# Altium schematic symbol library con-leotronics.SCHLIB: 93 symbols (part 2 of 4)

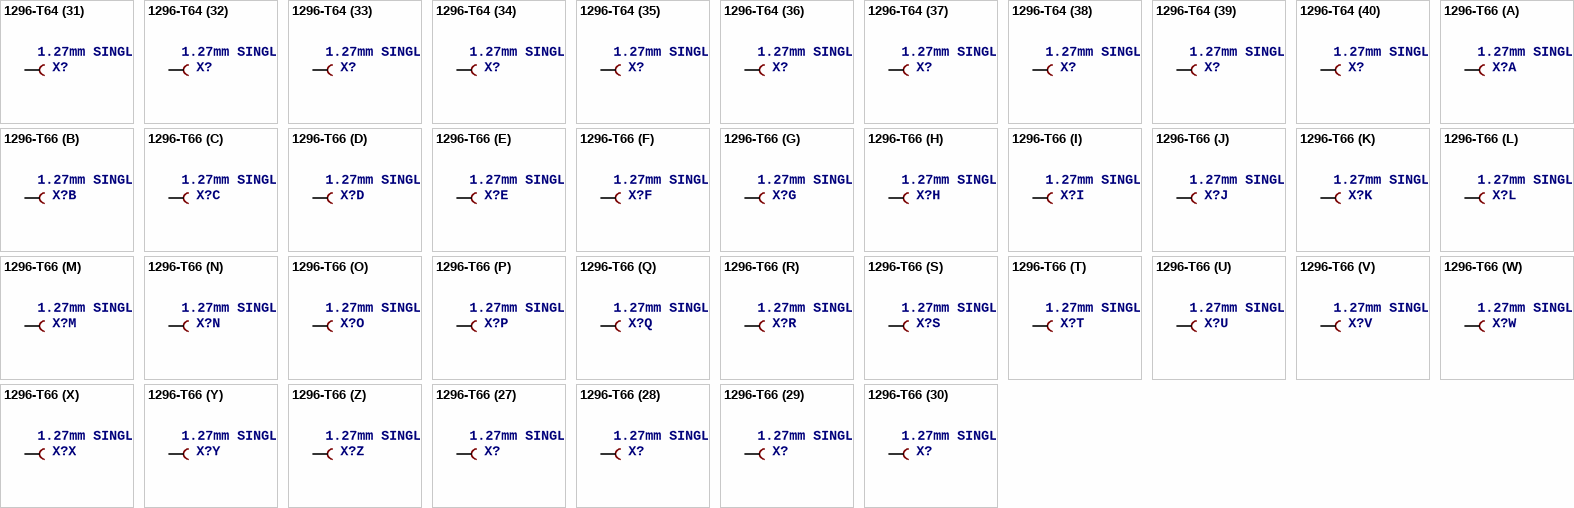
[diagram p23: symbols 1296-T64 to 1296-T66]

## 1296-T64
designator X?, comment 1.27mm SINGLE ROW FEMALE SOCKET   Source: http://www.leotronics.co.uk/Conexcon/Data%20Sheets/sec.%20A/1296ing.pdf
OC_FARNELL: unknown; OC_NEWARK: unknown
footprint 1296-64
part A pins: 1 B
part B pins: 2 B
part C pins: 3 B
part D pins: 4 B
part E pins: 5 B
part F pins: 6 B
part G pins: 7 B
part H pins: 8 B
part I pins: 9 B
part J pins: 10 B
part K pins: 11 B
part L pins: 12 B
part M pins: 13 B
part N pins: 14 B
part O pins: 15 B
part P pins: 16 B
part Q pins: 17 B
part R pins: 18 B
part S pins: 19 B
part T pins: 20 B
part U pins: 21 B
part V pins: 22 B
part W pins: 23 B
part X pins: 24 B
part Y pins: 25 B
part Z pins: 26 B
part 27 pins: 27 B
part 28 pins: 28 B
part 29 pins: 29 B
part 30 pins: 30 B
part 31 pins: 31 B
part 32 pins: 32 B
part 33 pins: 33 B
part 34 pins: 34 B
part 35 pins: 35 B
part 36 pins: 36 B
part 37 pins: 37 B
part 38 pins: 38 B
part 39 pins: 39 B
part 40 pins: 40 B
part 41 pins: 41 B
part 42 pins: 42 B
part 43 pins: 43 B
part 44 pins: 44 B
part 45 pins: 45 B
part 46 pins: 46 B
part 47 pins: 47 B
part 48 pins: 48 B
part 49 pins: 49 B
part 50 pins: 50 B
part 51 pins: 51 B
part 52 pins: 52 B
part 53 pins: 53 B
part 54 pins: 54 B
part 55 pins: 55 B
part 56 pins: 56 B
part 57 pins: 57 B
part 58 pins: 58 B
part 59 pins: 59 B
part 60 pins: 60 B
part 61 pins: 61 B
part 62 pins: 62 B
part 63 pins: 63 B
part 64 pins: 64 B

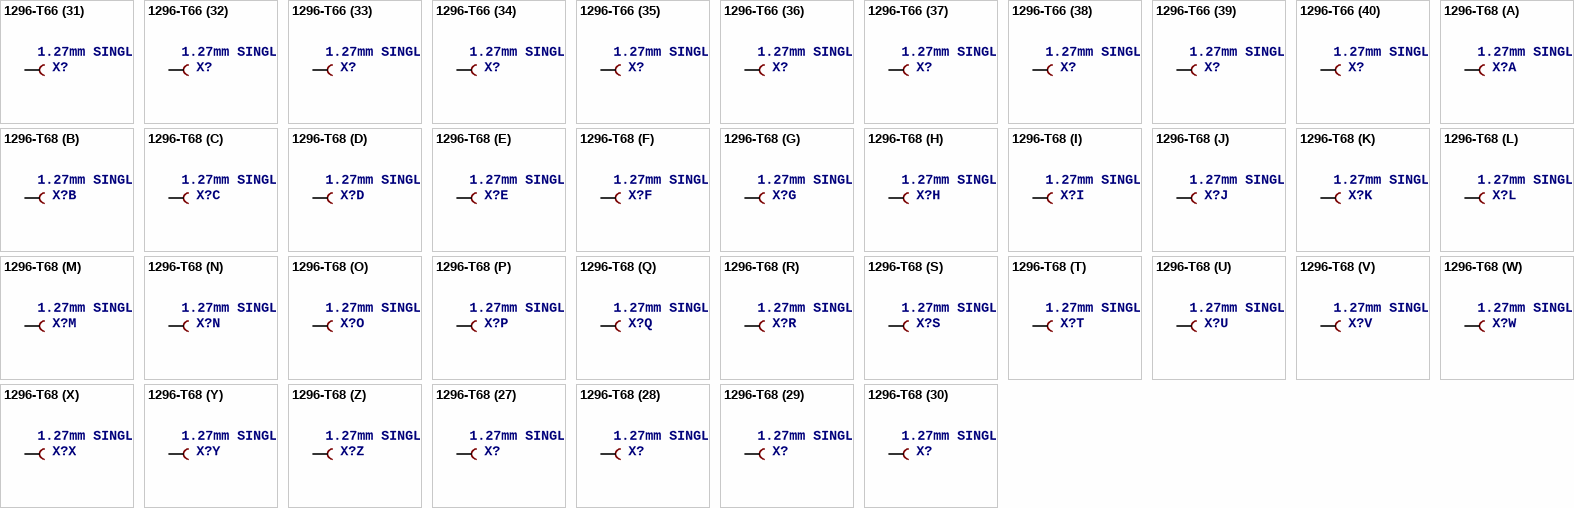
[diagram p24: symbols 1296-T66 to 1296-T68]

## 1296-T66
designator X?, comment 1.27mm SINGLE ROW FEMALE SOCKET   Source: http://www.leotronics.co.uk/Conexcon/Data%20Sheets/sec.%20A/1296ing.pdf
OC_FARNELL: unknown; OC_NEWARK: unknown
footprint 1296-66
part A pins: 1 B
part B pins: 2 B
part C pins: 3 B
part D pins: 4 B
part E pins: 5 B
part F pins: 6 B
part G pins: 7 B
part H pins: 8 B
part I pins: 9 B
part J pins: 10 B
part K pins: 11 B
part L pins: 12 B
part M pins: 13 B
part N pins: 14 B
part O pins: 15 B
part P pins: 16 B
part Q pins: 17 B
part R pins: 18 B
part S pins: 19 B
part T pins: 20 B
part U pins: 21 B
part V pins: 22 B
part W pins: 23 B
part X pins: 24 B
part Y pins: 25 B
part Z pins: 26 B
part 27 pins: 27 B
part 28 pins: 28 B
part 29 pins: 29 B
part 30 pins: 30 B
part 31 pins: 31 B
part 32 pins: 32 B
part 33 pins: 33 B
part 34 pins: 34 B
part 35 pins: 35 B
part 36 pins: 36 B
part 37 pins: 37 B
part 38 pins: 38 B
part 39 pins: 39 B
part 40 pins: 40 B
part 41 pins: 41 B
part 42 pins: 42 B
part 43 pins: 43 B
part 44 pins: 44 B
part 45 pins: 45 B
part 46 pins: 46 B
part 47 pins: 47 B
part 48 pins: 48 B
part 49 pins: 49 B
part 50 pins: 50 B
part 51 pins: 51 B
part 52 pins: 52 B
part 53 pins: 53 B
part 54 pins: 54 B
part 55 pins: 55 B
part 56 pins: 56 B
part 57 pins: 57 B
part 58 pins: 58 B
part 59 pins: 59 B
part 60 pins: 60 B
part 61 pins: 61 B
part 62 pins: 62 B
part 63 pins: 63 B
part 64 pins: 64 B
part 65 pins: 65 B
part 66 pins: 66 B

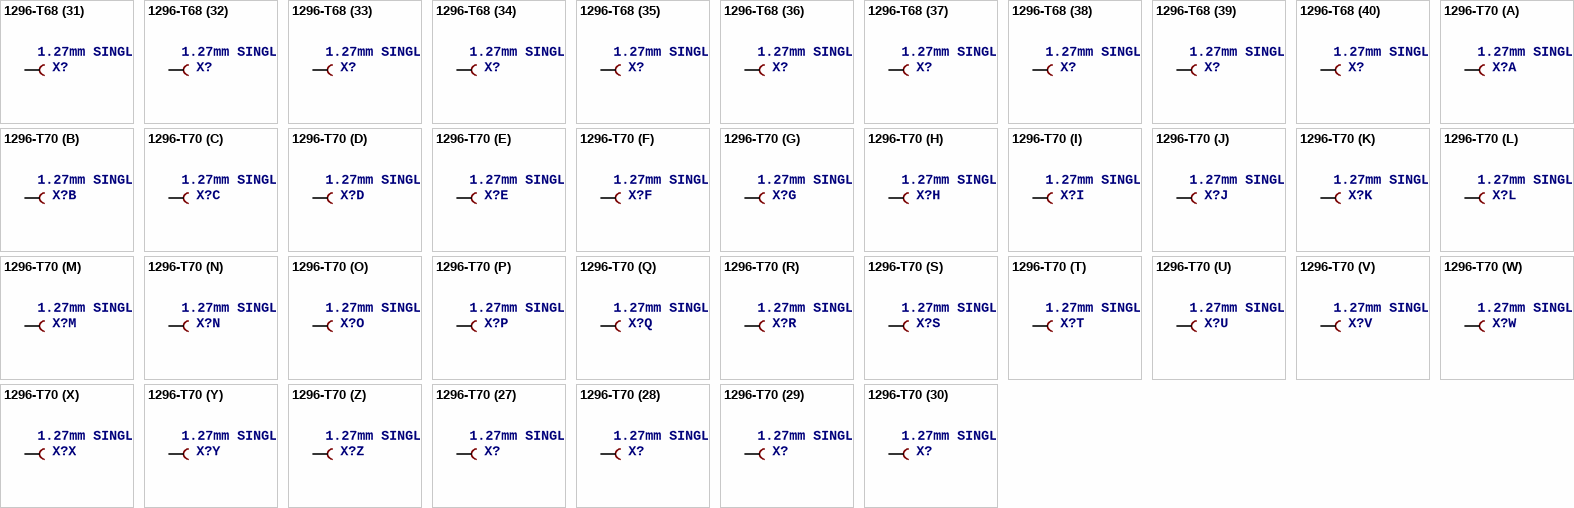
[diagram p25: symbols 1296-T68 to 1296-T70]

## 1296-T68
designator X?, comment 1.27mm SINGLE ROW FEMALE SOCKET   Source: http://www.leotronics.co.uk/Conexcon/Data%20Sheets/sec.%20A/1296ing.pdf
OC_FARNELL: unknown; OC_NEWARK: unknown
footprint 1296-68
part A pins: 1 B
part B pins: 2 B
part C pins: 3 B
part D pins: 4 B
part E pins: 5 B
part F pins: 6 B
part G pins: 7 B
part H pins: 8 B
part I pins: 9 B
part J pins: 10 B
part K pins: 11 B
part L pins: 12 B
part M pins: 13 B
part N pins: 14 B
part O pins: 15 B
part P pins: 16 B
part Q pins: 17 B
part R pins: 18 B
part S pins: 19 B
part T pins: 20 B
part U pins: 21 B
part V pins: 22 B
part W pins: 23 B
part X pins: 24 B
part Y pins: 25 B
part Z pins: 26 B
part 27 pins: 27 B
part 28 pins: 28 B
part 29 pins: 29 B
part 30 pins: 30 B
part 31 pins: 31 B
part 32 pins: 32 B
part 33 pins: 33 B
part 34 pins: 34 B
part 35 pins: 35 B
part 36 pins: 36 B
part 37 pins: 37 B
part 38 pins: 38 B
part 39 pins: 39 B
part 40 pins: 40 B
part 41 pins: 41 B
part 42 pins: 42 B
part 43 pins: 43 B
part 44 pins: 44 B
part 45 pins: 45 B
part 46 pins: 46 B
part 47 pins: 47 B
part 48 pins: 48 B
part 49 pins: 49 B
part 50 pins: 50 B
part 51 pins: 51 B
part 52 pins: 52 B
part 53 pins: 53 B
part 54 pins: 54 B
part 55 pins: 55 B
part 56 pins: 56 B
part 57 pins: 57 B
part 58 pins: 58 B
part 59 pins: 59 B
part 60 pins: 60 B
part 61 pins: 61 B
part 62 pins: 62 B
part 63 pins: 63 B
part 64 pins: 64 B
part 65 pins: 65 B
part 66 pins: 66 B
part 67 pins: 67 B
part 68 pins: 68 B

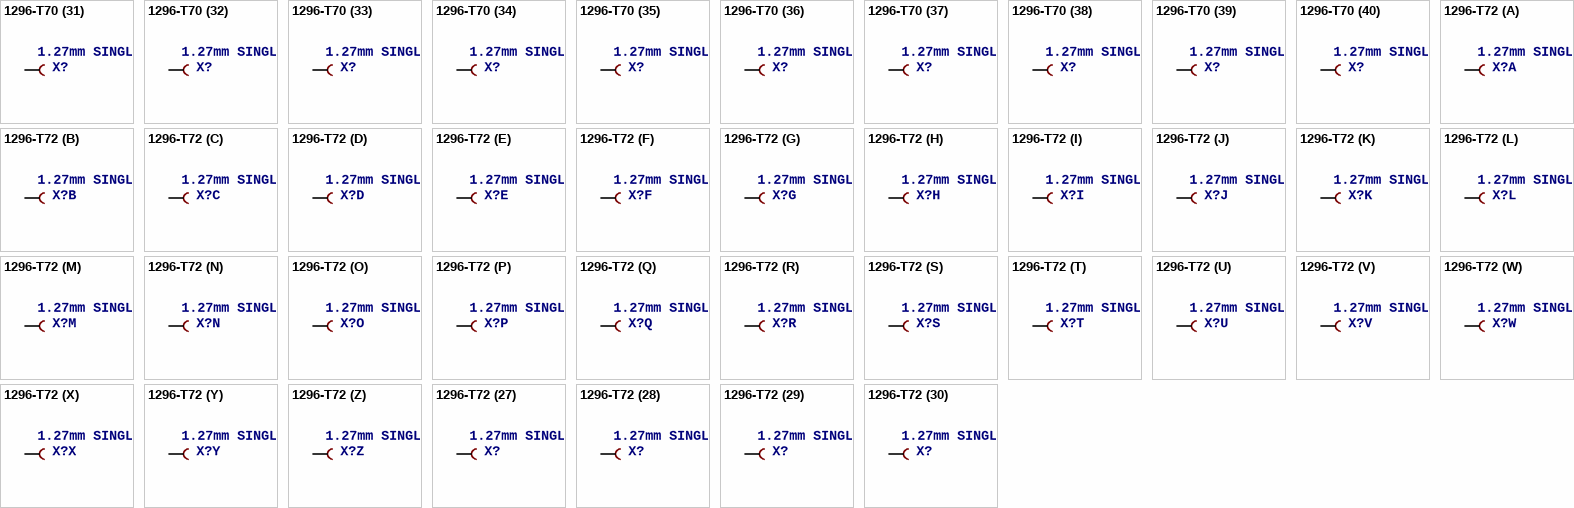
[diagram p26: symbols 1296-T70 to 1296-T72]

## 1296-T70
designator X?, comment 1.27mm SINGLE ROW FEMALE SOCKET   Source: http://www.leotronics.co.uk/Conexcon/Data%20Sheets/sec.%20A/1296ing.pdf
OC_FARNELL: unknown; OC_NEWARK: unknown
footprint 1296-70
part A pins: 1 B
part B pins: 2 B
part C pins: 3 B
part D pins: 4 B
part E pins: 5 B
part F pins: 6 B
part G pins: 7 B
part H pins: 8 B
part I pins: 9 B
part J pins: 10 B
part K pins: 11 B
part L pins: 12 B
part M pins: 13 B
part N pins: 14 B
part O pins: 15 B
part P pins: 16 B
part Q pins: 17 B
part R pins: 18 B
part S pins: 19 B
part T pins: 20 B
part U pins: 21 B
part V pins: 22 B
part W pins: 23 B
part X pins: 24 B
part Y pins: 25 B
part Z pins: 26 B
part 27 pins: 27 B
part 28 pins: 28 B
part 29 pins: 29 B
part 30 pins: 30 B
part 31 pins: 31 B
part 32 pins: 32 B
part 33 pins: 33 B
part 34 pins: 34 B
part 35 pins: 35 B
part 36 pins: 36 B
part 37 pins: 37 B
part 38 pins: 38 B
part 39 pins: 39 B
part 40 pins: 40 B
part 41 pins: 41 B
part 42 pins: 42 B
part 43 pins: 43 B
part 44 pins: 44 B
part 45 pins: 45 B
part 46 pins: 46 B
part 47 pins: 47 B
part 48 pins: 48 B
part 49 pins: 49 B
part 50 pins: 50 B
part 51 pins: 51 B
part 52 pins: 52 B
part 53 pins: 53 B
part 54 pins: 54 B
part 55 pins: 55 B
part 56 pins: 56 B
part 57 pins: 57 B
part 58 pins: 58 B
part 59 pins: 59 B
part 60 pins: 60 B
part 61 pins: 61 B
part 62 pins: 62 B
part 63 pins: 63 B
part 64 pins: 64 B
part 65 pins: 65 B
part 66 pins: 66 B
part 67 pins: 67 B
part 68 pins: 68 B
part 69 pins: 69 B
part 70 pins: 70 B

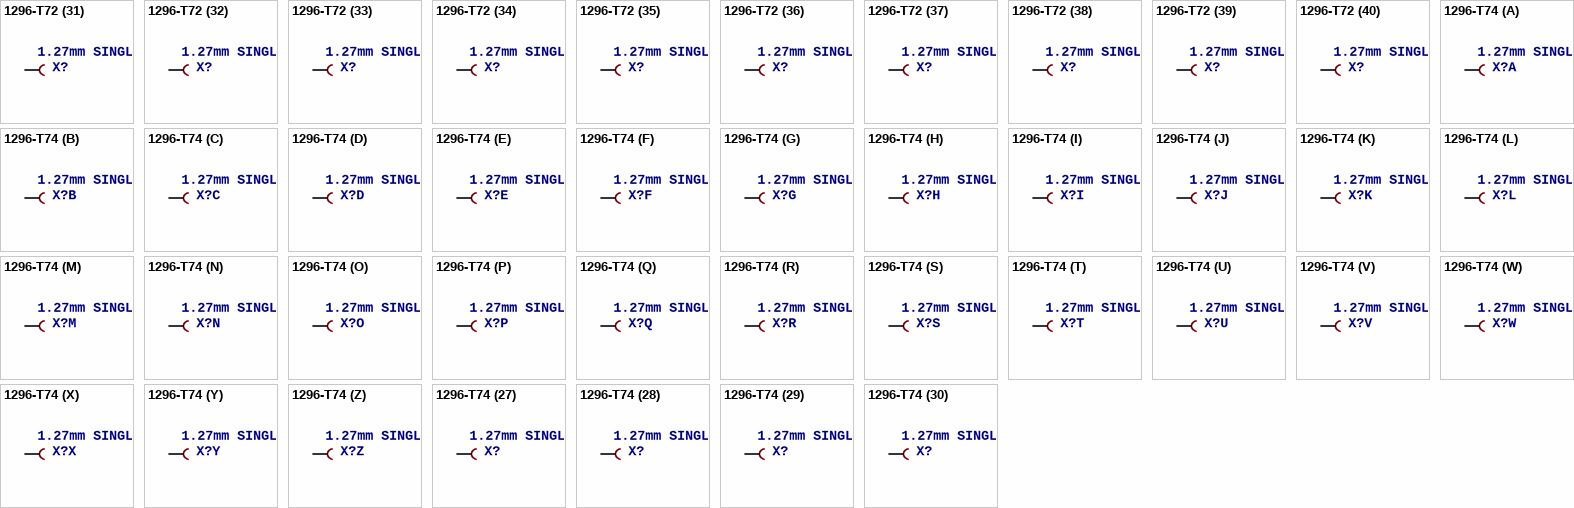
[diagram p27: symbols 1296-T72 to 1296-T74]

## 1296-T72
designator X?, comment 1.27mm SINGLE ROW FEMALE SOCKET   Source: http://www.leotronics.co.uk/Conexcon/Data%20Sheets/sec.%20A/1296ing.pdf
OC_FARNELL: unknown; OC_NEWARK: unknown
footprint 1296-72
part A pins: 1 B
part B pins: 2 B
part C pins: 3 B
part D pins: 4 B
part E pins: 5 B
part F pins: 6 B
part G pins: 7 B
part H pins: 8 B
part I pins: 9 B
part J pins: 10 B
part K pins: 11 B
part L pins: 12 B
part M pins: 13 B
part N pins: 14 B
part O pins: 15 B
part P pins: 16 B
part Q pins: 17 B
part R pins: 18 B
part S pins: 19 B
part T pins: 20 B
part U pins: 21 B
part V pins: 22 B
part W pins: 23 B
part X pins: 24 B
part Y pins: 25 B
part Z pins: 26 B
part 27 pins: 27 B
part 28 pins: 28 B
part 29 pins: 29 B
part 30 pins: 30 B
part 31 pins: 31 B
part 32 pins: 32 B
part 33 pins: 33 B
part 34 pins: 34 B
part 35 pins: 35 B
part 36 pins: 36 B
part 37 pins: 37 B
part 38 pins: 38 B
part 39 pins: 39 B
part 40 pins: 40 B
part 41 pins: 41 B
part 42 pins: 42 B
part 43 pins: 43 B
part 44 pins: 44 B
part 45 pins: 45 B
part 46 pins: 46 B
part 47 pins: 47 B
part 48 pins: 48 B
part 49 pins: 49 B
part 50 pins: 50 B
part 51 pins: 51 B
part 52 pins: 52 B
part 53 pins: 53 B
part 54 pins: 54 B
part 55 pins: 55 B
part 56 pins: 56 B
part 57 pins: 57 B
part 58 pins: 58 B
part 59 pins: 59 B
part 60 pins: 60 B
part 61 pins: 61 B
part 62 pins: 62 B
part 63 pins: 63 B
part 64 pins: 64 B
part 65 pins: 65 B
part 66 pins: 66 B
part 67 pins: 67 B
part 68 pins: 68 B
part 69 pins: 69 B
part 70 pins: 70 B
part 71 pins: 71 B
part 72 pins: 72 B

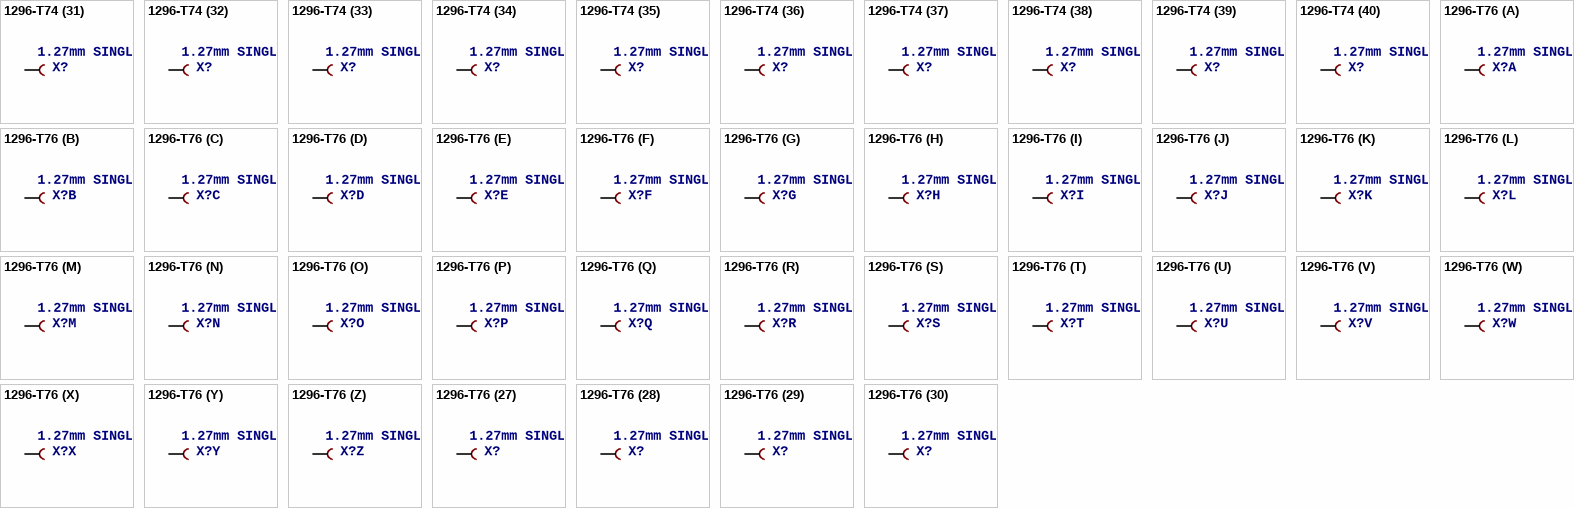
[diagram p28: symbols 1296-T74 to 1296-T76]

## 1296-T74
designator X?, comment 1.27mm SINGLE ROW FEMALE SOCKET   Source: http://www.leotronics.co.uk/Conexcon/Data%20Sheets/sec.%20A/1296ing.pdf
OC_FARNELL: unknown; OC_NEWARK: unknown
footprint 1296-74
part A pins: 1 B
part B pins: 2 B
part C pins: 3 B
part D pins: 4 B
part E pins: 5 B
part F pins: 6 B
part G pins: 7 B
part H pins: 8 B
part I pins: 9 B
part J pins: 10 B
part K pins: 11 B
part L pins: 12 B
part M pins: 13 B
part N pins: 14 B
part O pins: 15 B
part P pins: 16 B
part Q pins: 17 B
part R pins: 18 B
part S pins: 19 B
part T pins: 20 B
part U pins: 21 B
part V pins: 22 B
part W pins: 23 B
part X pins: 24 B
part Y pins: 25 B
part Z pins: 26 B
part 27 pins: 27 B
part 28 pins: 28 B
part 29 pins: 29 B
part 30 pins: 30 B
part 31 pins: 31 B
part 32 pins: 32 B
part 33 pins: 33 B
part 34 pins: 34 B
part 35 pins: 35 B
part 36 pins: 36 B
part 37 pins: 37 B
part 38 pins: 38 B
part 39 pins: 39 B
part 40 pins: 40 B
part 41 pins: 41 B
part 42 pins: 42 B
part 43 pins: 43 B
part 44 pins: 44 B
part 45 pins: 45 B
part 46 pins: 46 B
part 47 pins: 47 B
part 48 pins: 48 B
part 49 pins: 49 B
part 50 pins: 50 B
part 51 pins: 51 B
part 52 pins: 52 B
part 53 pins: 53 B
part 54 pins: 54 B
part 55 pins: 55 B
part 56 pins: 56 B
part 57 pins: 57 B
part 58 pins: 58 B
part 59 pins: 59 B
part 60 pins: 60 B
part 61 pins: 61 B
part 62 pins: 62 B
part 63 pins: 63 B
part 64 pins: 64 B
part 65 pins: 65 B
part 66 pins: 66 B
part 67 pins: 67 B
part 68 pins: 68 B
part 69 pins: 69 B
part 70 pins: 70 B
part 71 pins: 71 B
part 72 pins: 72 B
part 73 pins: 73 B
part 74 pins: 74 B

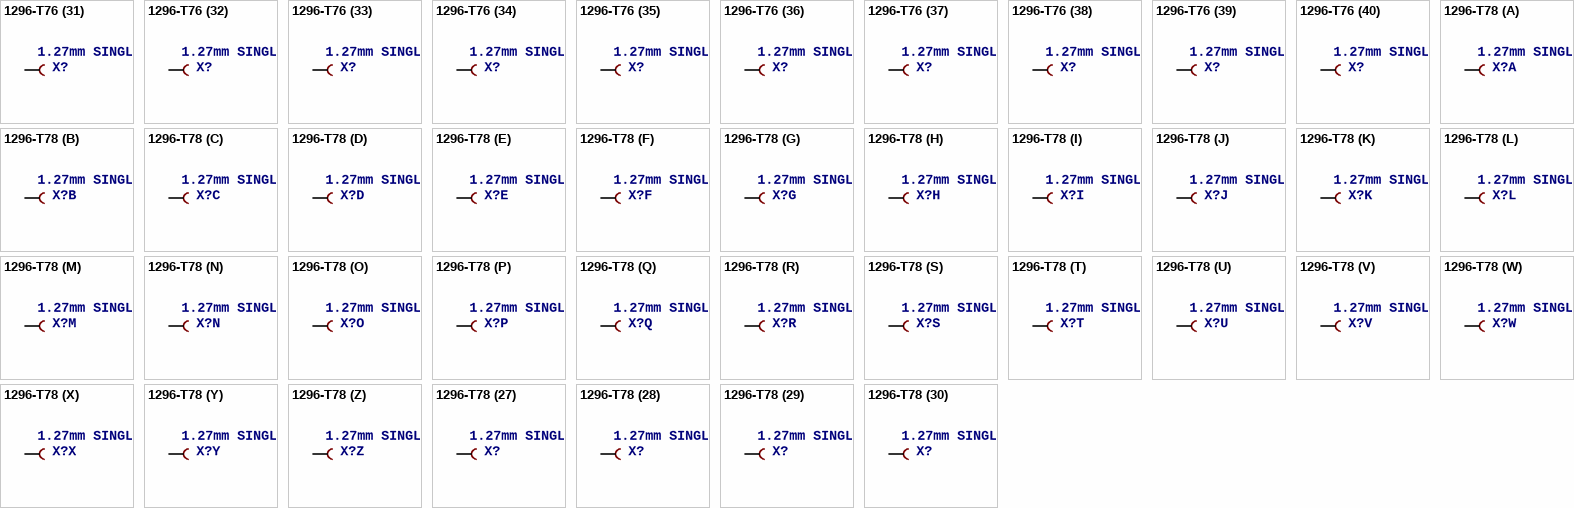
[diagram p29: symbols 1296-T76 to 1296-T78]

## 1296-T76
designator X?, comment 1.27mm SINGLE ROW FEMALE SOCKET   Source: http://www.leotronics.co.uk/Conexcon/Data%20Sheets/sec.%20A/1296ing.pdf
OC_FARNELL: unknown; OC_NEWARK: unknown
footprint 1296-76
part A pins: 1 B
part B pins: 2 B
part C pins: 3 B
part D pins: 4 B
part E pins: 5 B
part F pins: 6 B
part G pins: 7 B
part H pins: 8 B
part I pins: 9 B
part J pins: 10 B
part K pins: 11 B
part L pins: 12 B
part M pins: 13 B
part N pins: 14 B
part O pins: 15 B
part P pins: 16 B
part Q pins: 17 B
part R pins: 18 B
part S pins: 19 B
part T pins: 20 B
part U pins: 21 B
part V pins: 22 B
part W pins: 23 B
part X pins: 24 B
part Y pins: 25 B
part Z pins: 26 B
part 27 pins: 27 B
part 28 pins: 28 B
part 29 pins: 29 B
part 30 pins: 30 B
part 31 pins: 31 B
part 32 pins: 32 B
part 33 pins: 33 B
part 34 pins: 34 B
part 35 pins: 35 B
part 36 pins: 36 B
part 37 pins: 37 B
part 38 pins: 38 B
part 39 pins: 39 B
part 40 pins: 40 B
part 41 pins: 41 B
part 42 pins: 42 B
part 43 pins: 43 B
part 44 pins: 44 B
part 45 pins: 45 B
part 46 pins: 46 B
part 47 pins: 47 B
part 48 pins: 48 B
part 49 pins: 49 B
part 50 pins: 50 B
part 51 pins: 51 B
part 52 pins: 52 B
part 53 pins: 53 B
part 54 pins: 54 B
part 55 pins: 55 B
part 56 pins: 56 B
part 57 pins: 57 B
part 58 pins: 58 B
part 59 pins: 59 B
part 60 pins: 60 B
part 61 pins: 61 B
part 62 pins: 62 B
part 63 pins: 63 B
part 64 pins: 64 B
part 65 pins: 65 B
part 66 pins: 66 B
part 67 pins: 67 B
part 68 pins: 68 B
part 69 pins: 69 B
part 70 pins: 70 B
part 71 pins: 71 B
part 72 pins: 72 B
part 73 pins: 73 B
part 74 pins: 74 B
part 75 pins: 75 B
part 76 pins: 76 B

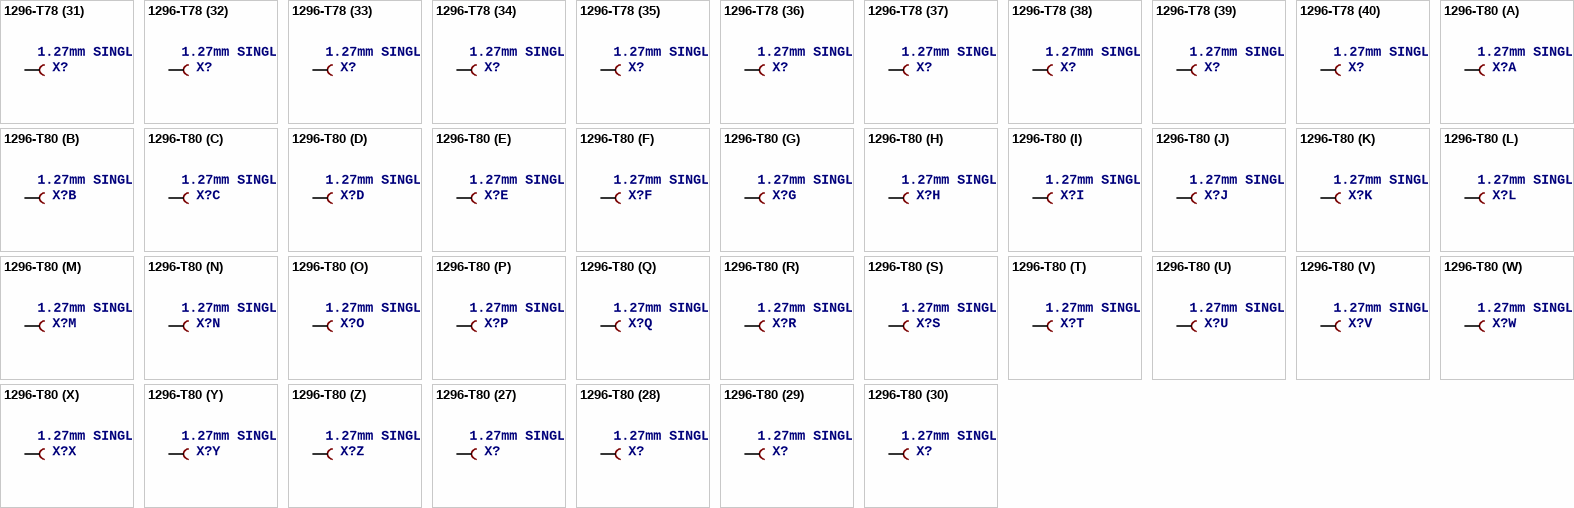
[diagram p30: symbols 1296-T78 to 1296-T80]

## 1296-T78
designator X?, comment 1.27mm SINGLE ROW FEMALE SOCKET   Source: http://www.leotronics.co.uk/Conexcon/Data%20Sheets/sec.%20A/1296ing.pdf
OC_FARNELL: unknown; OC_NEWARK: unknown
footprint 1296-78
part A pins: 1 B
part B pins: 2 B
part C pins: 3 B
part D pins: 4 B
part E pins: 5 B
part F pins: 6 B
part G pins: 7 B
part H pins: 8 B
part I pins: 9 B
part J pins: 10 B
part K pins: 11 B
part L pins: 12 B
part M pins: 13 B
part N pins: 14 B
part O pins: 15 B
part P pins: 16 B
part Q pins: 17 B
part R pins: 18 B
part S pins: 19 B
part T pins: 20 B
part U pins: 21 B
part V pins: 22 B
part W pins: 23 B
part X pins: 24 B
part Y pins: 25 B
part Z pins: 26 B
part 27 pins: 27 B
part 28 pins: 28 B
part 29 pins: 29 B
part 30 pins: 30 B
part 31 pins: 31 B
part 32 pins: 32 B
part 33 pins: 33 B
part 34 pins: 34 B
part 35 pins: 35 B
part 36 pins: 36 B
part 37 pins: 37 B
part 38 pins: 38 B
part 39 pins: 39 B
part 40 pins: 40 B
part 41 pins: 41 B
part 42 pins: 42 B
part 43 pins: 43 B
part 44 pins: 44 B
part 45 pins: 45 B
part 46 pins: 46 B
part 47 pins: 47 B
part 48 pins: 48 B
part 49 pins: 49 B
part 50 pins: 50 B
part 51 pins: 51 B
part 52 pins: 52 B
part 53 pins: 53 B
part 54 pins: 54 B
part 55 pins: 55 B
part 56 pins: 56 B
part 57 pins: 57 B
part 58 pins: 58 B
part 59 pins: 59 B
part 60 pins: 60 B
part 61 pins: 61 B
part 62 pins: 62 B
part 63 pins: 63 B
part 64 pins: 64 B
part 65 pins: 65 B
part 66 pins: 66 B
part 67 pins: 67 B
part 68 pins: 68 B
part 69 pins: 69 B
part 70 pins: 70 B
part 71 pins: 71 B
part 72 pins: 72 B
part 73 pins: 73 B
part 74 pins: 74 B
part 75 pins: 75 B
part 76 pins: 76 B
part 77 pins: 77 B
part 78 pins: 78 B

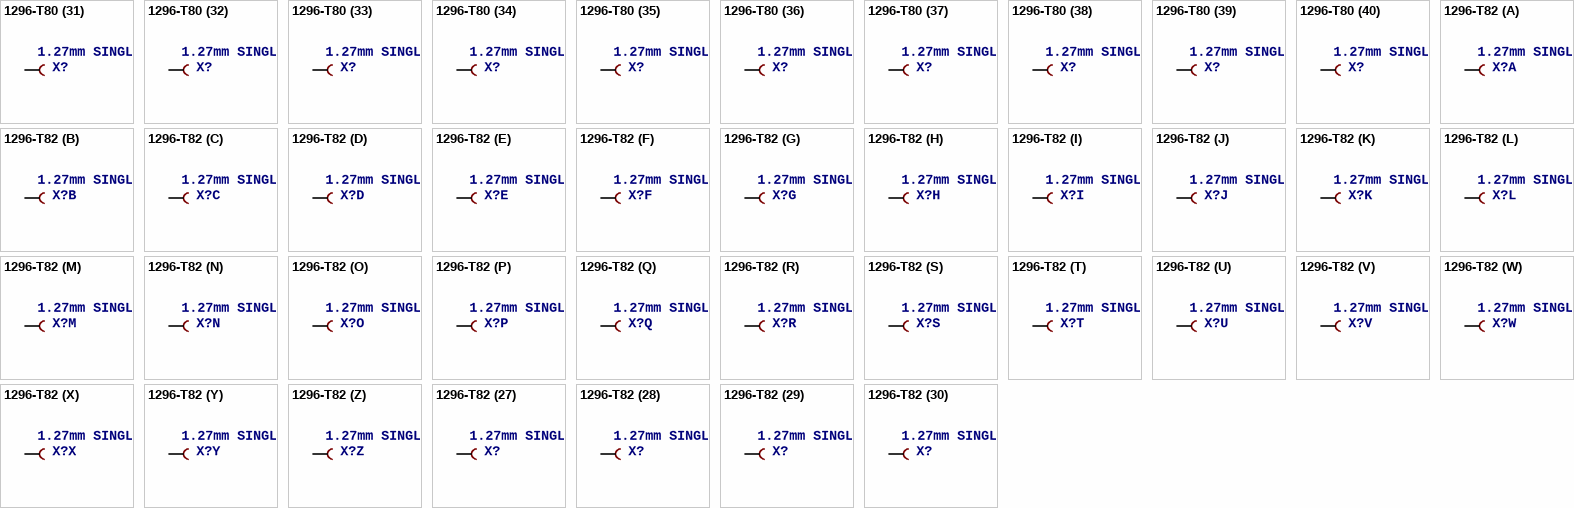
[diagram p31: symbols 1296-T80 to 1296-T82]

## 1296-T80
designator X?, comment 1.27mm SINGLE ROW FEMALE SOCKET   Source: http://www.leotronics.co.uk/Conexcon/Data%20Sheets/sec.%20A/1296ing.pdf
OC_FARNELL: unknown; OC_NEWARK: unknown
footprint 1296-80
part A pins: 1 B
part B pins: 2 B
part C pins: 3 B
part D pins: 4 B
part E pins: 5 B
part F pins: 6 B
part G pins: 7 B
part H pins: 8 B
part I pins: 9 B
part J pins: 10 B
part K pins: 11 B
part L pins: 12 B
part M pins: 13 B
part N pins: 14 B
part O pins: 15 B
part P pins: 16 B
part Q pins: 17 B
part R pins: 18 B
part S pins: 19 B
part T pins: 20 B
part U pins: 21 B
part V pins: 22 B
part W pins: 23 B
part X pins: 24 B
part Y pins: 25 B
part Z pins: 26 B
part 27 pins: 27 B
part 28 pins: 28 B
part 29 pins: 29 B
part 30 pins: 30 B
part 31 pins: 31 B
part 32 pins: 32 B
part 33 pins: 33 B
part 34 pins: 34 B
part 35 pins: 35 B
part 36 pins: 36 B
part 37 pins: 37 B
part 38 pins: 38 B
part 39 pins: 39 B
part 40 pins: 40 B
part 41 pins: 41 B
part 42 pins: 42 B
part 43 pins: 43 B
part 44 pins: 44 B
part 45 pins: 45 B
part 46 pins: 46 B
part 47 pins: 47 B
part 48 pins: 48 B
part 49 pins: 49 B
part 50 pins: 50 B
part 51 pins: 51 B
part 52 pins: 52 B
part 53 pins: 53 B
part 54 pins: 54 B
part 55 pins: 55 B
part 56 pins: 56 B
part 57 pins: 57 B
part 58 pins: 58 B
part 59 pins: 59 B
part 60 pins: 60 B
part 61 pins: 61 B
part 62 pins: 62 B
part 63 pins: 63 B
part 64 pins: 64 B
part 65 pins: 65 B
part 66 pins: 66 B
part 67 pins: 67 B
part 68 pins: 68 B
part 69 pins: 69 B
part 70 pins: 70 B
part 71 pins: 71 B
part 72 pins: 72 B
part 73 pins: 73 B
part 74 pins: 74 B
part 75 pins: 75 B
part 76 pins: 76 B
part 77 pins: 77 B
part 78 pins: 78 B
part 79 pins: 79 B
part 80 pins: 80 B

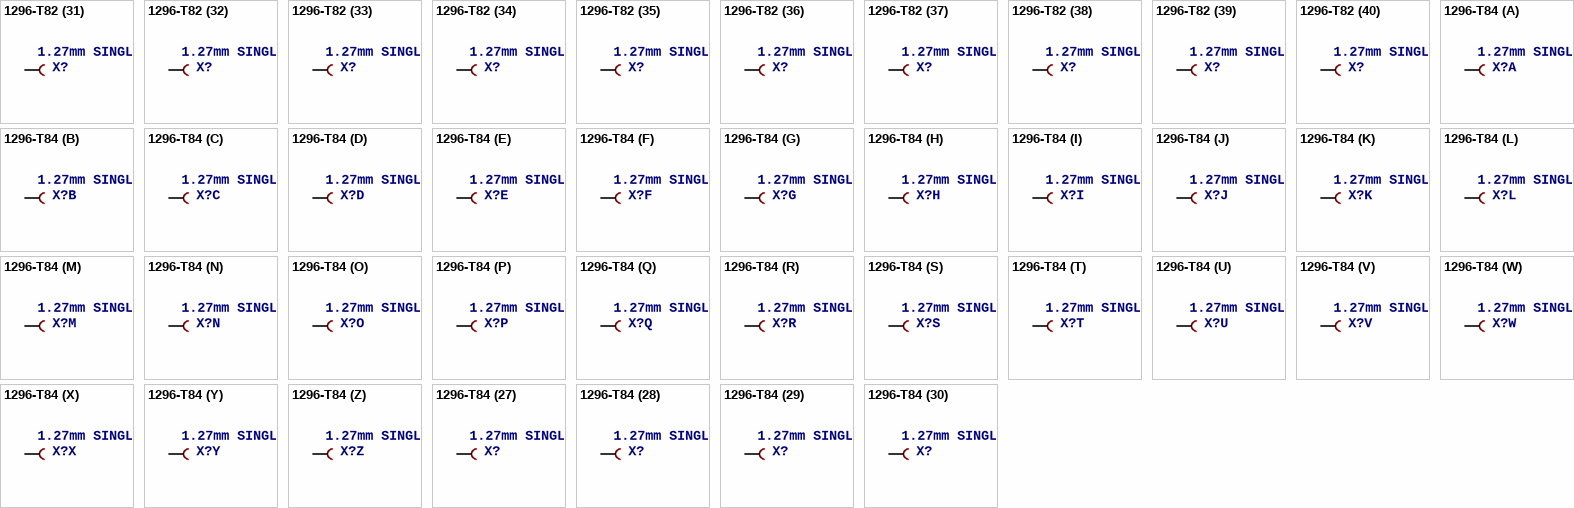
[diagram p32: symbols 1296-T82 to 1296-T84]

## 1296-T82
designator X?, comment 1.27mm SINGLE ROW FEMALE SOCKET   Source: http://www.leotronics.co.uk/Conexcon/Data%20Sheets/sec.%20A/1296ing.pdf
OC_FARNELL: unknown; OC_NEWARK: unknown
footprint 1296-82
part A pins: 1 B
part B pins: 2 B
part C pins: 3 B
part D pins: 4 B
part E pins: 5 B
part F pins: 6 B
part G pins: 7 B
part H pins: 8 B
part I pins: 9 B
part J pins: 10 B
part K pins: 11 B
part L pins: 12 B
part M pins: 13 B
part N pins: 14 B
part O pins: 15 B
part P pins: 16 B
part Q pins: 17 B
part R pins: 18 B
part S pins: 19 B
part T pins: 20 B
part U pins: 21 B
part V pins: 22 B
part W pins: 23 B
part X pins: 24 B
part Y pins: 25 B
part Z pins: 26 B
part 27 pins: 27 B
part 28 pins: 28 B
part 29 pins: 29 B
part 30 pins: 30 B
part 31 pins: 31 B
part 32 pins: 32 B
part 33 pins: 33 B
part 34 pins: 34 B
part 35 pins: 35 B
part 36 pins: 36 B
part 37 pins: 37 B
part 38 pins: 38 B
part 39 pins: 39 B
part 40 pins: 40 B
part 41 pins: 41 B
part 42 pins: 42 B
part 43 pins: 43 B
part 44 pins: 44 B
part 45 pins: 45 B
part 46 pins: 46 B
part 47 pins: 47 B
part 48 pins: 48 B
part 49 pins: 49 B
part 50 pins: 50 B
part 51 pins: 51 B
part 52 pins: 52 B
part 53 pins: 53 B
part 54 pins: 54 B
part 55 pins: 55 B
part 56 pins: 56 B
part 57 pins: 57 B
part 58 pins: 58 B
part 59 pins: 59 B
part 60 pins: 60 B
part 61 pins: 61 B
part 62 pins: 62 B
part 63 pins: 63 B
part 64 pins: 64 B
part 65 pins: 65 B
part 66 pins: 66 B
part 67 pins: 67 B
part 68 pins: 68 B
part 69 pins: 69 B
part 70 pins: 70 B
part 71 pins: 71 B
part 72 pins: 72 B
part 73 pins: 73 B
part 74 pins: 74 B
part 75 pins: 75 B
part 76 pins: 76 B
part 77 pins: 77 B
part 78 pins: 78 B
part 79 pins: 79 B
part 80 pins: 80 B
part 81 pins: 81 B
part 82 pins: 82 B

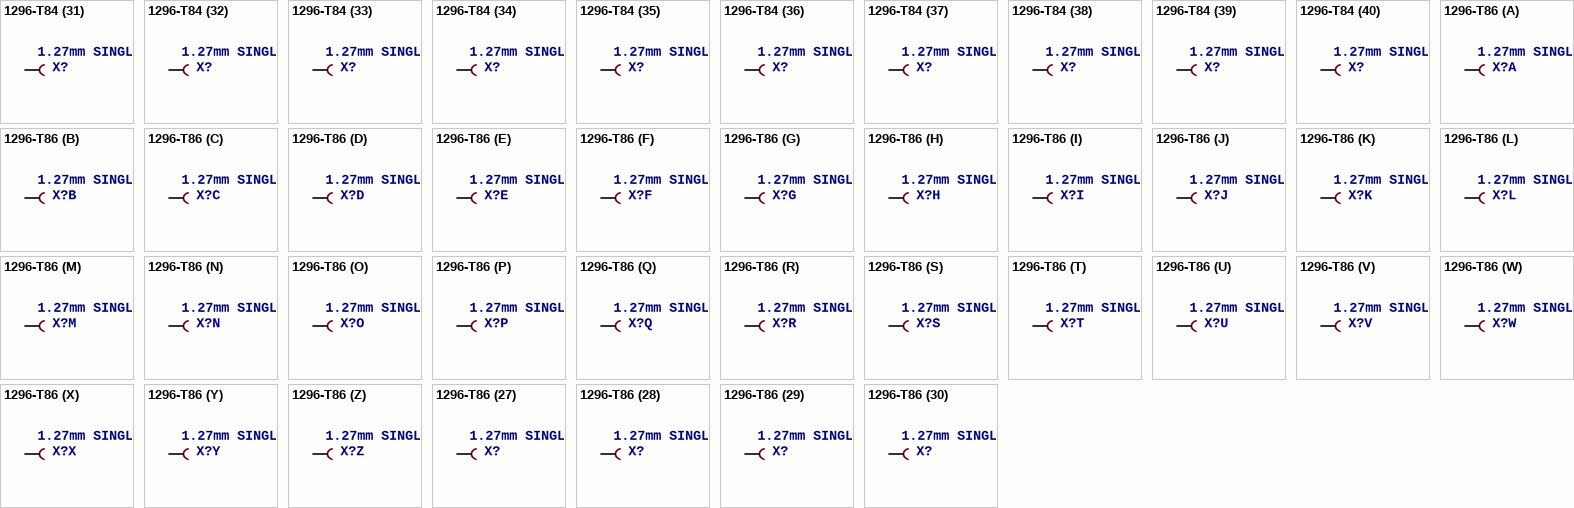
[diagram p33: symbols 1296-T84 to 1296-T86]

## 1296-T84
designator X?, comment 1.27mm SINGLE ROW FEMALE SOCKET   Source: http://www.leotronics.co.uk/Conexcon/Data%20Sheets/sec.%20A/1296ing.pdf
OC_FARNELL: unknown; OC_NEWARK: unknown
footprint 1296-84
part A pins: 1 B
part B pins: 2 B
part C pins: 3 B
part D pins: 4 B
part E pins: 5 B
part F pins: 6 B
part G pins: 7 B
part H pins: 8 B
part I pins: 9 B
part J pins: 10 B
part K pins: 11 B
part L pins: 12 B
part M pins: 13 B
part N pins: 14 B
part O pins: 15 B
part P pins: 16 B
part Q pins: 17 B
part R pins: 18 B
part S pins: 19 B
part T pins: 20 B
part U pins: 21 B
part V pins: 22 B
part W pins: 23 B
part X pins: 24 B
part Y pins: 25 B
part Z pins: 26 B
part 27 pins: 27 B
part 28 pins: 28 B
part 29 pins: 29 B
part 30 pins: 30 B
part 31 pins: 31 B
part 32 pins: 32 B
part 33 pins: 33 B
part 34 pins: 34 B
part 35 pins: 35 B
part 36 pins: 36 B
part 37 pins: 37 B
part 38 pins: 38 B
part 39 pins: 39 B
part 40 pins: 40 B
part 41 pins: 41 B
part 42 pins: 42 B
part 43 pins: 43 B
part 44 pins: 44 B
part 45 pins: 45 B
part 46 pins: 46 B
part 47 pins: 47 B
part 48 pins: 48 B
part 49 pins: 49 B
part 50 pins: 50 B
part 51 pins: 51 B
part 52 pins: 52 B
part 53 pins: 53 B
part 54 pins: 54 B
part 55 pins: 55 B
part 56 pins: 56 B
part 57 pins: 57 B
part 58 pins: 58 B
part 59 pins: 59 B
part 60 pins: 60 B
part 61 pins: 61 B
part 62 pins: 62 B
part 63 pins: 63 B
part 64 pins: 64 B
part 65 pins: 65 B
part 66 pins: 66 B
part 67 pins: 67 B
part 68 pins: 68 B
part 69 pins: 69 B
part 70 pins: 70 B
part 71 pins: 71 B
part 72 pins: 72 B
part 73 pins: 73 B
part 74 pins: 74 B
part 75 pins: 75 B
part 76 pins: 76 B
part 77 pins: 77 B
part 78 pins: 78 B
part 79 pins: 79 B
part 80 pins: 80 B
part 81 pins: 81 B
part 82 pins: 82 B
part 83 pins: 83 B
part 84 pins: 84 B

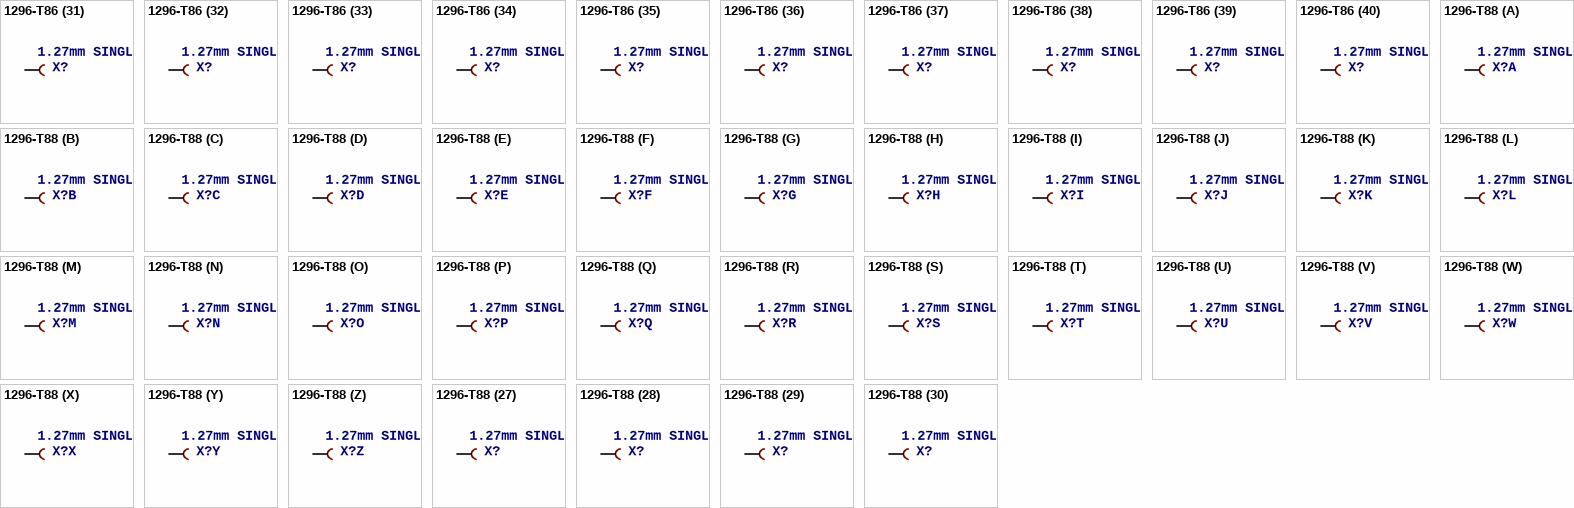
[diagram p34: symbols 1296-T86 to 1296-T88]
